# Altium footprint library kalios.PcbLib: 404 footprints (part 2 of 26)
Each footprint in its own frame and in the unit in brackets; x right, y up, seen from the top. Pads: shape width x height; smd on the part's side, far side on the other; paste and mask are expansions set on the pad; w line width, h text height; cw(c..) or ccw(c..) is an arc to the next point about the centre after c.
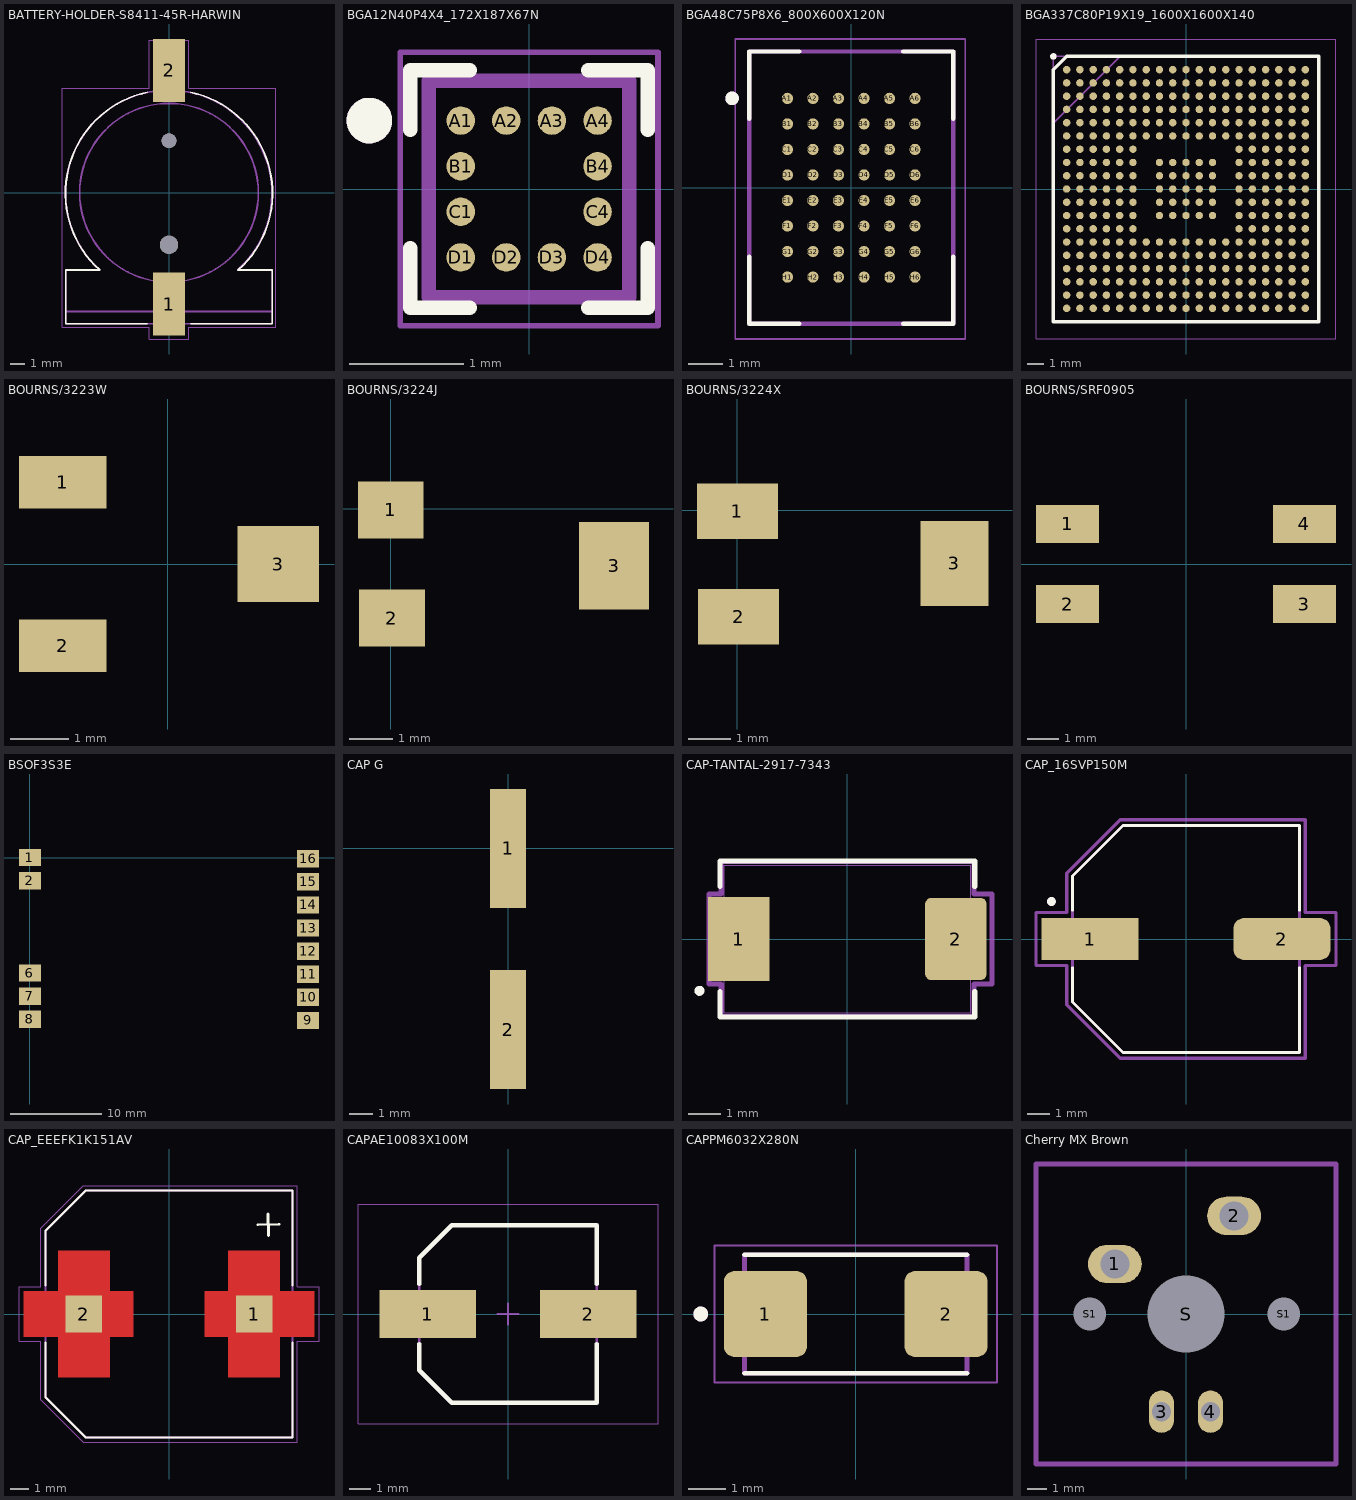
[diagram p1: the footprints below, top view; thin cyan lines are the x and y axes]

## BATTERY-HOLDER-S8411-45R-HARWIN [mm] "Battery Holder (Open) Coin, 12.0mm 1 Cell SMD (SMT) Tab"
pads (4):
  rect 2.3x4.5 smd: 1(0,-7.975) 2(0,8.763)
  round 1.3 hole 1.3 unplated: ""(0,-3.725)
  round 1.05 hole 1.05 unplated: ""(0,3.725)
Top Overlay:
  lines w0.127: -4.975,-5.525 -7.4,-5.525 -7.4,-9.375 -1.55,-9.375 ; -4.971,-5.529 cw(c-0.026,-0.037) -1.562,7.192 ; 1.55,-9.375 7.4,-9.375 7.4,-5.525 4.925,-5.525 ; 1.562,7.192 cw(c0.026,-0.037) 4.971,-5.529
Top 3D Body:
  circle w0.127: c0,0 r6.4
  lines w0.127: -4.975,-5.525 -7.4,-5.525 -7.4,-8.5 ; -4.97,-5.529 cw(c-0.025,-0.037) 4.92,-5.529 ; 4.925,-5.525 7.4,-5.525 7.4,-8.5 ; -7.4,-8.5 7.4,-8.5 ; -7.4,-8.5 -7.4,-9.375 7.4,-9.375 7.4,-8.5
Top Courtyard:
  lines w0.05: -7.65,-9.625 -7.65,7.5 -1.4,7.5 -1.4,10.925 1.4,10.925 1.4,7.5 7.65,7.5 7.65,-9.625 1.4,-9.625 1.4,-10.475 -1.4,-10.475 -1.4,-9.625 -7.65,-9.625
Top Designator:
  text ".Designator" at -7.618,-0.201 h1.52
3D body "s8411-45r_asm.STEP": height 4.33, standoff -0.92, extent -7.374,-9.03 7.375,10.171

## BGA12N40P4X4_172X187X67N [mm]
pads (12):
  round 0.25 smd: A1(-0.6,0.6) A2(-0.2,0.6) A3(0.2,0.6) A4(0.6,0.6) B1(-0.6,0.2) B4(0.6,0.2) C1(-0.6,-0.2) C4(0.6,-0.2) D1(-0.6,-0.6) D2(-0.2,-0.6) D3(0.2,-0.6) D4(0.6,-0.6)
Top Overlay:
  circle w0.2: c-1.4,0.6 r0.1
  lines w0.127: -1.04,-0.52 -1.04,-1.04 -0.52,-1.04 ; -1.04,0.52 -1.04,1.04 -0.52,1.04 ; 0.52,-1.04 1.04,-1.04 1.04,-0.52 ; 0.52,1.04 1.04,1.04 1.04,0.52
Top 3D Body:
  circle w0.2: c-1.4,0.6 r0.1
  lines w0.127: -0.88,-0.95 -0.88,0.95 0.88,0.95 0.88,-0.95 -0.88,-0.95
Top Courtyard:
  lines w0.05: -1.13,-1.2 -1.13,1.2 1.13,1.2 1.13,-1.2 -1.13,-1.2
3D body "step_temp.STEP": height 0.67, standoff 0.01, extent -0.863,-0.937 0.863,0.937

## BGA48C75P8X6_800X600X120N [mm]
pads (48):
  round 0.33 smd: A1(-1.875,2.625) A2(-1.125,2.625) A3(-0.375,2.625) A4(0.375,2.625) A5(1.125,2.625) A6(1.875,2.625) B1(-1.875,1.875) B2(-1.125,1.875) B3(-0.375,1.875) B4(0.375,1.875) B5(1.125,1.875) B6(1.875,1.875) C1(-1.875,1.125) C2(-1.125,1.125) C3(-0.375,1.125) C4(0.375,1.125) C5(1.125,1.125) C6(1.875,1.125) D1(-1.875,0.375) D2(-1.125,0.375) D3(-0.375,0.375) D4(0.375,0.375) D5(1.125,0.375) D6(1.875,0.375) E1(-1.875,-0.375) E2(-1.125,-0.375) E3(-0.375,-0.375) E4(0.375,-0.375) E5(1.125,-0.375) E6(1.875,-0.375) F1(-1.875,-1.125) F2(-1.125,-1.125) F3(-0.375,-1.125) F4(0.375,-1.125) F5(1.125,-1.125) F6(1.875,-1.125) G1(-1.875,-1.875) G2(-1.125,-1.875) G3(-0.375,-1.875) G4(0.375,-1.875) G5(1.125,-1.875) G6(1.875,-1.875) H1(-1.875,-2.625) H2(-1.125,-2.625) H3(-0.375,-2.625) H4(0.375,-2.625) H5(1.125,-2.625) H6(1.875,-2.625)
Top Overlay:
  circle w0.2: c-3.5,2.625 r0.1
  lines w0.127: -3,-2.025 -3,-4 -1.525,-4 ; -3,2.025 -3,4 -1.525,4 ; 1.525,-4 3,-4 3,-2.025 ; 1.525,4 3,4 3,2.025
Top 3D Body:
  circle w0.2: c-3.5,2.625 r0.1
  lines w0.127: -3,-4 3,-4 3,4 -3,4 -3,-4
Top Courtyard:
  lines w0.05: -3.404,-4.445 3.353,-4.445 3.353,4.369 -3.404,4.369 -3.404,-4.445
3D body "IS61WV25616EDBLL-8BLI.STEP": height 1.2, standoff 0, extent -3,-4 3,4

## BGA337C80P19X19_1600X1600X140 [mm]
pads (337):
  round 0.45 smd: A1(-7.2,7.2) A2(-6.4,7.2) A3(-5.6,7.2) A4(-4.8,7.2) A5(-4,7.2) A6(-3.2,7.2) A7(-2.4,7.2) A8(-1.6,7.2) A9(-0.8,7.2) A10(0,7.2) A11(0.8,7.2) A12(1.6,7.2) A13(2.4,7.2) A14(3.2,7.2) A15(4,7.2) A16(4.8,7.2) A17(5.6,7.2) A18(6.4,7.2) A19(7.2,7.2) B1(-7.2,6.4) B2(-6.4,6.4) B3(-5.6,6.4) B4(-4.8,6.4) B5(-4,6.4) B6(-3.2,6.4) B7(-2.4,6.4) B8(-1.6,6.4) B9(-0.8,6.4) B10(0,6.4) B11(0.8,6.4) B12(1.6,6.4) B13(2.4,6.4) B14(3.2,6.4) B15(4,6.4) B16(4.8,6.4) B17(5.6,6.4) B18(6.4,6.4) B19(7.2,6.4) C1(-7.2,5.6) C2(-6.4,5.6) C3(-5.6,5.6) C4(-4.8,5.6) C5(-4,5.6) C6(-3.2,5.6) C7(-2.4,5.6) C8(-1.6,5.6) C9(-0.8,5.6) C10(0,5.6) C11(0.8,5.6) C12(1.6,5.6) C13(2.4,5.6) C14(3.2,5.6) C15(4,5.6) C16(4.8,5.6) C17(5.6,5.6) C18(6.4,5.6) C19(7.2,5.6) D1(-7.2,4.8) D2(-6.4,4.8) D3(-5.6,4.8) D4(-4.8,4.8) D5(-4,4.8) D6(-3.2,4.8) D7(-2.4,4.8) D8(-1.6,4.8) D9(-0.8,4.8) D10(0,4.8) D11(0.8,4.8) D12(1.6,4.8) D13(2.4,4.8) D14(3.2,4.8) D15(4,4.8) D16(4.8,4.8) D17(5.6,4.8) D18(6.4,4.8) D19(7.2,4.8) E1(-7.2,4) E2(-6.4,4) E3(-5.6,4) E4(-4.8,4) E5(-4,4) E6(-3.2,4) E7(-2.4,4) E8(-1.6,4) E9(-0.8,4) E10(0,4) E11(0.8,4) E12(1.6,4) E13(2.4,4) E14(3.2,4) E15(4,4) E16(4.8,4) E17(5.6,4) E18(6.4,4) E19(7.2,4) F1(-7.2,3.2) F2(-6.4,3.2) F3(-5.6,3.2) F4(-4.8,3.2) F5(-4,3.2) F6(-3.2,3.2) F7(-2.4,3.2) F8(-1.6,3.2) F9(-0.8,3.2) F10(0,3.2) F11(0.8,3.2) F12(1.6,3.2) F13(2.4,3.2) F14(3.2,3.2) F15(4,3.2) F16(4.8,3.2) F17(5.6,3.2) F18(6.4,3.2) F19(7.2,3.2) G1(-7.2,2.4) G2(-6.4,2.4) G3(-5.6,2.4) G4(-4.8,2.4) G5(-4,2.4) G6(-3.2,2.4) G14(3.2,2.4) G15(4,2.4) G16(4.8,2.4) G17(5.6,2.4) G18(6.4,2.4) G19(7.2,2.4) H1(-7.2,1.6) H2(-6.4,1.6) H3(-5.6,1.6) H4(-4.8,1.6) H5(-4,1.6) H6(-3.2,1.6) H8(-1.6,1.6) H9(-0.8,1.6) H10(0,1.6) H11(0.8,1.6) H12(1.6,1.6) H14(3.2,1.6) H15(4,1.6) H16(4.8,1.6) H17(5.6,1.6) H18(6.4,1.6) H19(7.2,1.6) J1(-7.2,0.8) J2(-6.4,0.8) J3(-5.6,0.8) J4(-4.8,0.8) J5(-4,0.8) J6(-3.2,0.8) J8(-1.6,0.8) J9(-0.8,0.8) J10(0,0.8) J11(0.8,0.8) J12(1.6,0.8) J14(3.2,0.8) J15(4,0.8) J16(4.8,0.8) J17(5.6,0.8) J18(6.4,0.8) J19(7.2,0.8) K1(-7.2,0) K2(-6.4,0) K3(-5.6,0) K4(-4.8,0) K5(-4,0) K6(-3.2,0) K8(-1.6,0) K9(-0.8,0) K10(0,0) K11(0.8,0) K12(1.6,0) K14(3.2,0) K15(4,0) K16(4.8,0) K17(5.6,0) K18(6.4,0) K19(7.2,0) L1(-7.2,-0.8) L2(-6.4,-0.8) L3(-5.6,-0.8) L4(-4.8,-0.8) L5(-4,-0.8) L6(-3.2,-0.8) L8(-1.6,-0.8) L9(-0.8,-0.8) L10(0,-0.8) L11(0.8,-0.8) L12(1.6,-0.8) L14(3.2,-0.8) L15(4,-0.8) L16(4.8,-0.8) L17(5.6,-0.8) L18(6.4,-0.8) L19(7.2,-0.8) M1(-7.2,-1.6) M2(-6.4,-1.6) M3(-5.6,-1.6) M4(-4.8,-1.6) M5(-4,-1.6) M6(-3.2,-1.6) M8(-1.6,-1.6) M9(-0.8,-1.6) M10(0,-1.6) M11(0.8,-1.6) M12(1.6,-1.6) M14(3.2,-1.6) M15(4,-1.6) M16(4.8,-1.6) M17(5.6,-1.6) M18(6.4,-1.6) M19(7.2,-1.6) N1(-7.2,-2.4) N2(-6.4,-2.4) N3(-5.6,-2.4) N4(-4.8,-2.4) N5(-4,-2.4) N6(-3.2,-2.4) N14(3.2,-2.4) N15(4,-2.4) N16(4.8,-2.4) N17(5.6,-2.4) N18(6.4,-2.4) N19(7.2,-2.4) P1(-7.2,-3.2) P2(-6.4,-3.2) P3(-5.6,-3.2) P4(-4.8,-3.2) P5(-4,-3.2) P6(-3.2,-3.2) P7(-2.4,-3.2) P8(-1.6,-3.2) P9(-0.8,-3.2) P10(0,-3.2) P11(0.8,-3.2) P12(1.6,-3.2) P13(2.4,-3.2) P14(3.2,-3.2) P15(4,-3.2) P16(4.8,-3.2) P17(5.6,-3.2) P18(6.4,-3.2) P19(7.2,-3.2) R1(-7.2,-4) R2(-6.4,-4) R3(-5.6,-4) R4(-4.8,-4) R5(-4,-4) R6(-3.2,-4) R7(-2.4,-4) R8(-1.6,-4) R9(-0.8,-4) R10(0,-4) R11(0.8,-4) R12(1.6,-4) R13(2.4,-4) R14(3.2,-4) R15(4,-4) R16(4.8,-4) R17(5.6,-4) R18(6.4,-4) R19(7.2,-4) T1(-7.2,-4.8) T2(-6.4,-4.8) T3(-5.6,-4.8) T4(-4.8,-4.8) T5(-4,-4.8) T6(-3.2,-4.8) T7(-2.4,-4.8) T8(-1.6,-4.8) T9(-0.8,-4.8) T10(0,-4.8) T11(0.8,-4.8) T12(1.6,-4.8) T13(2.4,-4.8) T14(3.2,-4.8) T15(4,-4.8) T16(4.8,-4.8) T17(5.6,-4.8) T18(6.4,-4.8) T19(7.2,-4.8) U1(-7.2,-5.6) U2(-6.4,-5.6) U3(-5.6,-5.6) U4(-4.8,-5.6) U5(-4,-5.6) U6(-3.2,-5.6) U7(-2.4,-5.6) U8(-1.6,-5.6) U9(-0.8,-5.6) U10(0,-5.6) U11(0.8,-5.6) U12(1.6,-5.6) U13(2.4,-5.6) U14(3.2,-5.6) U15(4,-5.6) U16(4.8,-5.6) U17(5.6,-5.6) U18(6.4,-5.6) U19(7.2,-5.6) V1(-7.2,-6.4) V2(-6.4,-6.4) V3(-5.6,-6.4) V4(-4.8,-6.4) V5(-4,-6.4) V6(-3.2,-6.4) V7(-2.4,-6.4) V8(-1.6,-6.4) V9(-0.8,-6.4) V10(0,-6.4) V11(0.8,-6.4) V12(1.6,-6.4) V13(2.4,-6.4) V14(3.2,-6.4) V15(4,-6.4) V16(4.8,-6.4) V17(5.6,-6.4) V18(6.4,-6.4) V19(7.2,-6.4) W1(-7.2,-7.2) W2(-6.4,-7.2) W3(-5.6,-7.2) W4(-4.8,-7.2) W5(-4,-7.2) W6(-3.2,-7.2) W7(-2.4,-7.2) W8(-1.6,-7.2) W9(-0.8,-7.2) W10(0,-7.2) W11(0.8,-7.2) W12(1.6,-7.2) W13(2.4,-7.2) W14(3.2,-7.2) W15(4,-7.2) W16(4.8,-7.2) W17(5.6,-7.2) W18(6.4,-7.2) W19(7.2,-7.2)
Top Overlay:
  circle w0.2: c-8,8 r0.1
  lines w0.2: -8,-8 8,-8 8,8 -7.2,8 -8,7.2 -8,-8
Top 3D Body:
  lines w0.1: -8,3.975 -3.975,8 ; -8,-8 8,-8 8,8 -8,8 -8,-8
Top Courtyard:
  lines w0.05: -9.05,-9.05 9.05,-9.05 9.05,9.05 -9.05,9.05 -9.05,-9.05
3D body "F28388DZWTS.stp": height 1.34, standoff 0, extent -8,-8 8,8

## BOURNS/3223W [mm]
pads (3):
  rect 1.5x0.9 smd: 1(-1.8,1.4) 2(-1.8,-1.4)
  rect 1.4x1.3 smd: 3(1.9,0)
Top Designator:
  text ".Designator" at -7.593,-0.526 h1.52
3D body "3223W.STEP": height 4.2, standoff 0.04, extent -1.83,-1.987 1.69,1.913

## BOURNS/3224J [mm]
pads (3):
  rect 1.5x1.3 smd: 1(0,-0.025) 2(0.025,-2.5)
  rect 1.6x2 smd: 3(5.1,-1.3)
Top Designator:
  text ".Designator" at -5.043,-1.808 h1.52
3D body "3224J.STEP": height 4, standoff 0.1, extent 0.05,-3.7 5.1,1.1

## BOURNS/3224X [mm]
pads (3):
  rect 1.9x1.3 smd: 1(0,-0.025) 2(0.025,-2.5)
  rect 1.6x2 smd: 3(5.1,-1.25)
Top Designator:
  text ".Designator" at -5.143,-1.752 h1.52
3D body "3224W.STEP": height 5.4, standoff 0.1, extent 0.692,-3.644 4.592,1.156

## BOURNS/SRF0905 [mm]
pads (4):
  rect 2x1.2 smd: 1(-3.75,1.27) 2(-3.75,-1.27) 3(3.75,-1.27) 4(3.75,1.27)
Top Designator:
  text ".Designator" at -7.618,-0.505 h1.52
3D body "SRF0905.STEP": height 4.6, standoff -0.4, extent -4.575,-2.997 4.625,3.003

## BSOF3S3E [mm]
pads (13):
  rect 2.4x1.9 smd: 1(0,0) 2(0,-2.54) 6(0,-12.7) 7(0,-15.24) 8(0,-17.78) 9(30.582,-17.907) 10(30.582,-15.367) 11(30.582,-12.827) 12(30.582,-10.287) 13(30.582,-7.747) 14(30.582,-5.207) 15(30.582,-2.667) 16(30.582,-0.127)
Top Designator:
  text ".Designator" at 7.673,-9.423 h1.52
3D body "E3S3F OSB.STEP": height 12.82, standoff -0.01, extent -0.025,-21.615 30.455,3.785

## CAP G [mm]
pads (2):
  rect 1.5x5 smd: 1(0,0) 2(0,-7.62)
Top Designator:
  text ".Designator" at -7.688,-4.318 h1.52
3D body "User Library-ALU-G.STEP": height 10.2, standoff 0, extent -5.22,-9.61 5.08,1.99

## CAP-TANTAL-2917-7343 [mm]
pads (2):
  rect 1.87x2.541 smd paste+0 mask+0: 1(-3.3,0)
  rrect20% 1.87x2.5 smd paste+0 mask+0: 2(3.3,0)
Top Overlay:
  circle w0.152: c-4.496,-1.575 r0.076
  lines w0.152: -3.873,-1.598 -3.873,-2.375 3.873,-2.375 3.873,-1.598 ; -3.873,1.598 -3.873,2.375 3.873,2.375 3.873,1.598
Top 3D Body:
  circle w0: c-3.492,0 r0.076
  lines w0.025: -3.746,-2.248 3.746,-2.248 3.746,2.248 -3.746,2.248 -3.746,-2.248
Top Courtyard:
  lines w0.152: -4.2,-1.372 -4.2,1.372 -3.848,1.372 -3.848,2.349 3.848,2.349 3.848,1.372 4.4,1.372 4.4,-1.372 3.848,-1.372 3.848,-2.349 -3.848,-2.349 -3.848,-1.372 -4.2,-1.372
Top Designator:
  text ".Designator" at -4.199,0.167 h0.7
3D body "User Library-AVX_D_CASE.step": height 3.01, standoff 0, extent -3.7,-2.225 3.7,2.225

## CAP_16SVP150M [mm]
pads (2):
  rect 4.4x1.9 smd: 1(-4.35,0)
  rrect50% 4.4x1.9 smd: 2(4.35,0)
Top Overlay:
  circle w0.2: c-6.1,1.7 r0.1
  lines w0.127: -5.15,-1.3 -5.15,-2.85 -2.85,-5.15 5.15,-5.15 5.15,-1.3 ; -5.15,1.3 -5.15,2.85 -2.85,5.15 5.15,5.15 5.15,1.3
Top 3D Body:
  circle w0.2: c-6.1,1.7 r0.1
  lines w0.127: -5.15,-2.85 -5.15,2.85 -2.85,5.15 5.15,5.15 5.15,-5.15 -2.85,-5.15 -5.15,-2.85
Top Courtyard:
  lines w0.15: -6.8,-1.2 -6.8,1.2 -5.4,1.2 -5.4,2.975 -2.975,5.4 5.4,5.4 5.4,1.2 6.8,1.2 6.8,-1.2 5.4,-1.2 5.4,-5.4 -2.975,-5.4 -5.4,-2.975 -5.4,-1.2 -6.8,-1.2
Top Designator:
  text ".Designator" at -7.618,-0.508 h1.52
3D body "16SVP150M.STEP": height 7.9, standoff 0, extent -5.5,-5.15 5.5,5.15

## CAP_EEEFK1K151AV [mm]
pads (2):
  rect 2x2 smd paste-2 mask+0: 1(4.65,0) 2(-4.65,0)
Top Layer:
  region: -3.25,1.25 -1.95,1.25 -1.95,-1.25 -3.25,-1.25 -3.25,-3.45 -6.05,-3.45 -6.05,-1.25 -7.95,-1.25 -7.95,1.25 -6.05,1.25 -6.05,3.45 -3.25,3.45
  region: 6.05,1.25 7.95,1.25 7.95,-1.25 6.05,-1.25 6.05,-3.45 3.25,-3.45 3.25,-1.25 1.95,-1.25 1.95,1.25 3.25,1.25 3.25,3.45 6.05,3.45
Top Overlay:
  lines w0.127: -6.75,-1.57 -6.75,-4.55 -4.55,-6.75 6.75,-6.75 6.75,-1.57 ; -6.75,1.57 -6.75,4.55 -4.55,6.75 6.75,6.75 6.75,1.57
  lines w0.152: 4.851,4.877 6.02,4.902 ; 5.41,5.461 5.436,4.293
Top Paste:
  region: -3.25,1.25 -1.95,1.25 -1.95,-1.25 -3.25,-1.25 -3.25,-3.45 -6.05,-3.45 -6.05,-1.25 -7.95,-1.25 -7.95,1.25 -6.05,1.25 -6.05,3.45 -3.25,3.45
  region: 6.05,1.25 7.95,1.25 7.95,-1.25 6.05,-1.25 6.05,-3.45 3.25,-3.45 3.25,-1.25 1.95,-1.25 1.95,1.25 3.25,1.25 3.25,3.45 6.05,3.45
Top Solder:
  region: -3.15,1.35 -1.85,1.35 -1.85,-1.35 -3.15,-1.35 -3.15,-3.55 -6.15,-3.55 -6.15,-1.35 -8.05,-1.35 -8.05,1.35 -6.15,1.35 -6.15,3.55 -3.15,3.55
  region: 6.15,1.35 8.05,1.35 8.05,-1.35 6.15,-1.35 6.15,-3.55 3.15,-3.55 3.15,-1.35 1.85,-1.35 1.85,1.35 3.15,1.35 3.15,3.55 6.15,3.55
Top 3D Body:
  lines w0.127: -6.75,-4.55 -6.75,4.55 -4.55,6.75 6.75,6.75 6.75,-6.75 -4.55,-6.75 -6.75,-4.55
Top Courtyard:
  lines w0.05: -8.2,-1.5 -7,-1.5 -7,-4.675 -4.675,-7 7,-7 7,-1.5 8.2,-1.5 8.2,1.5 7,1.5 7,7 -4.675,7 -7,4.675 -7,1.5 -8.2,1.5 -8.2,-1.5
3D body "step_temp.STEP": height 13.8, standoff 0, extent -7.45,-6.75 7.45,6.75

## CAPAE10083X100M [mm] "Aluminum Electrolytic Capacitor, Body 8.30x8.30x10.00mm, IPC Low Density"
height 10
pads (2):
  rect 4.55x2.25 smd: 1(-3.8,0) 2(3.8,0)
Top Overlay:
  lines w0.2: -4.2,-1.425 -4.2,-2.663 -2.662,-4.2 4.2,-4.2 4.2,-1.425 ; -4.2,1.425 -4.2,2.662 -2.662,4.2 4.2,4.2 4.2,1.425
Top 3D Body:
  lines w0.1: -4.2,-2.663 -2.662,-4.2 4.2,-4.2 4.2,4.2 -2.662,4.2 -4.2,2.662 -4.2,-2.663
Top Courtyard:
  lines w0.05: -7.1,-5.2 -7.1,5.2 7.1,5.2 7.1,-5.2 -7.1,-5.2
  lines w0.1: -0.5,0 0.5,0 ; 0,-0.5 0,0.5
Top Designator:
  text ".Designator" at -7.618,-0.508 h1.52
3D body "cap.STEP": height 10.2, standoff 0, extent -4.825,-4.15 4.875,4.15

## CAPPM6032X280N [mm]
pads (2):
  rrect25% 2.24x2.32 smd: 1(-2.435,0) 2(2.435,0)
Top Overlay:
  circle w0.2: c-4.18,0 r0.1
  lines w0.127: -3,-1.6 3,-1.6 ; -3,1.6 3,1.6
Top 3D Body:
  circle w0.2: c-4.18,0 r0.1
  lines w0.127: -3,-1.6 -3,1.6 3,1.6 3,-1.6 -3,-1.6
Top Courtyard:
  lines w0.05: -3.81,-1.85 -3.805,1.85 3.81,1.85 3.81,-1.85 -3.81,-1.85
Top Designator:
  text ".Designator" at -7.89,-0.508 h1.52
3D body "AVX_C_CASE.STEP": height 2.7, standoff 0, extent -3.05,-1.675 3.05,1.675

## Cherry MX Brown [mm]
height 12
pads (7):
  oval 2.8x2 hole 1.5: 1(-3.7,2.6) 2(2.5,5.1)
  oval 1.3x2.2 hole 1: 3(-1.27,-5.08) 4(1.27,-5.08)
  round 3.9 hole 4 unplated: S(0,0)
  round 0.9 hole 1.7: S1(-5,0) S1(5.08,0)
Board:
  lines w0.254: -7.8,-7.8 7.8,-7.8 7.8,7.8 -7.8,7.8 -7.8,-7.8
Top Designator:
  text ".Designator" at -7.618,-0.508 h1.52
3D body "CherryMX.STEP": height 15.5, standoff -3.1, extent -7.8,-7.8 7.8,7.8